# Altium footprint library Footprints.PcbLib: 118 footprints (part 8 of 8)
Each footprint in its own frame and in the unit in brackets; x right, y up, seen from the top. Pads: shape width x height; smd on the part's side, far side on the other; paste and mask are expansions set on the pad; w line width, h text height; cw(c..) or ccw(c..) is an arc to the next point about the centre after c.
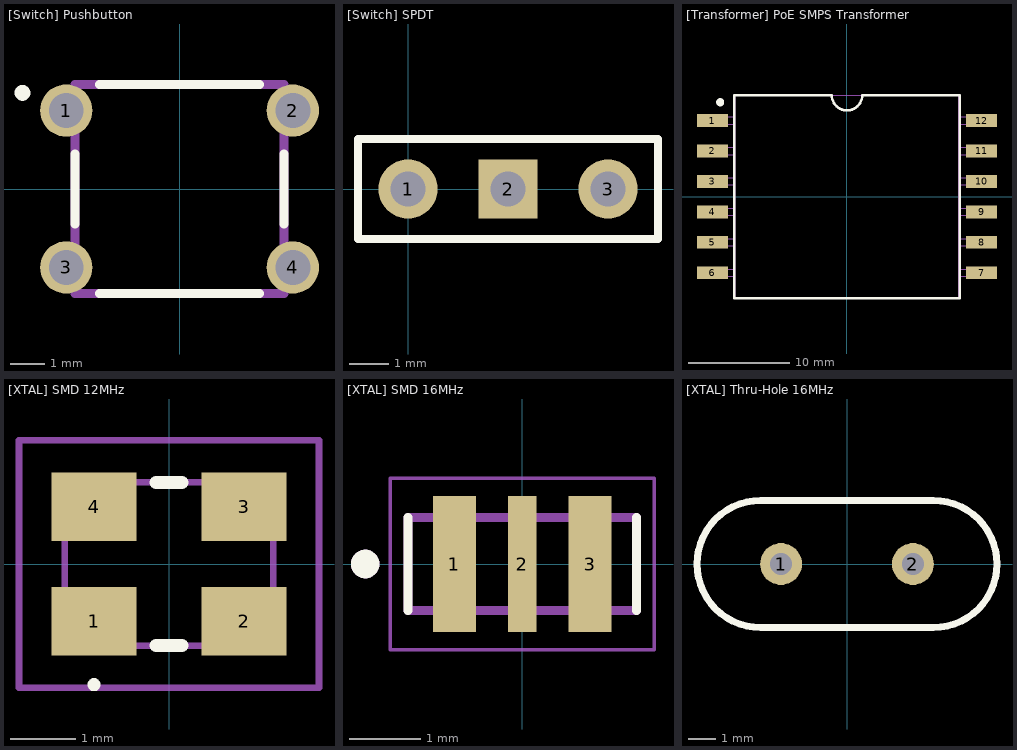
[diagram p7: the footprints below, top view; thin cyan lines are the x and y axes]

## [Switch] Pushbutton [mm] "(Regular pushbutton)"
pads (4):
  round 1.5 hole 1: 1(-3.25,2.25) 2(3.25,2.25) 3(-3.25,-2.25) 4(3.25,-2.25)
Top Overlay:
  circle w0.254: c-4.504,2.757 r0.099
  lines w0.254: -2.995,-1 -2.995,1 ; -2.3,-2.995 2.3,-2.995 ; -2.3,2.995 2.3,2.995 ; 2.995,-1 2.995,1
Physical Outline:
  lines w0.254: -2.995,-2.995 -2.995,2.995 2.995,2.995 2.995,-2.995 -2.995,-2.995
3D body "Pushbutton.STEP": height 4.95, standoff -3.38, extent -3.846,-3.004 3.846,3.004

## [Switch] SPDT [mm]
pads (3):
  round 1.5 hole 0.9: 1(0,0) 3(5.08,0)
  rect 1.5x1.5 hole 0.9: 2(2.54,0)
Top Overlay:
  lines w0.2: -1.27,-1.27 6.35,-1.27 6.35,1.27 -1.27,1.27 -1.27,-1.27
3D body "SPDT Switch.STEP": height 7.15, standoff -3.45, extent -1.71,-1.85 6.79,1.85

## [Transformer] PoE SMPS Transformer [mm] "750313355"
pads (12):
  rect 3.05x1.27 smd: 1(-13.26,7.5) 2(-13.26,4.5) 3(-13.26,1.5) 4(-13.26,-1.5) 5(-13.26,-4.5) 6(-13.26,-7.5) 7(13.26,-7.5) 8(13.26,-4.5) 9(13.26,-1.5) 10(13.26,1.5) 11(13.26,4.5) 12(13.26,7.5)
Top Overlay:
  circle w0.4: c-12.5,9.3 r0.2
  lines w0.254: -11.1,-10 11.1,-10 11.1,10 1.5,10 cw(c0,10) -1.5,10 -11.1,10 -11.1,-10
Physical Outline:
  lines w0.1: -11,-7.85 -14.54,-7.85 -14.54,-7.15 -11,-7.15 ; -11,-4.85 -14.54,-4.85 -14.54,-4.15 -11,-4.15 ; -11,-1.85 -14.54,-1.85 -14.54,-1.15 -11,-1.15 ; -11,1.15 -14.54,1.15 -14.54,1.85 -11,1.85 ; -11,4.15 -14.54,4.15 -14.54,4.85 -11,4.85 ; 11,-7.85 14.54,-7.85 14.54,-7.15 11,-7.15 ; 11,-4.85 14.54,-4.85 14.54,-4.15 11,-4.15 ; 11,-1.85 14.54,-1.85 14.54,-1.15 11,-1.15 ; 11,1.15 14.54,1.15 14.54,1.85 11,1.85 ; 11,4.15 14.54,4.15 14.54,4.85 11,4.85 ; 11,7.15 14.54,7.15 14.54,7.85 11,7.85 ; -11,7.15 -11,7.85 ; -11,7.15 -11,-10 11,-10 11,10 -11,10 -11,7.85 ; -11,7.15 -14.54,7.15 -14.54,7.85 -11,7.85
3D body "PoE Transformer 750313355.STEP": height 10.67, standoff 0, extent -14.325,-10 14.325,10

## [XTAL] SMD 12MHz [mm]
pads (4):
  rect 1.3x1.05 smd: 1(-1.15,-0.875) 2(1.15,-0.875) 3(1.15,0.875) 4(-1.15,0.875)
Top Overlay:
  lines w0.1: -1.15,-1.9 ccw(c-1.15,-1.85) -1.15,-1.8 ccw(c-1.15,-1.85) -1.15,-1.9
  lines w0.2: -0.2,-1.25 0.2,-1.25 ; -0.2,1.25 0.2,1.25
Physical Outline:
  lines w0.1: -1.6,-1.25 1.6,-1.25 1.6,1.25 -1.6,1.25 -1.6,-1.25
Part Border:
  lines w0.1: -2.3,-1.9 2.3,-1.9 2.3,1.9 -2.3,1.9 -2.3,-1.9
3D body "ABM8-272-T3.stp": height 0.75, standoff 0, extent -1.6,-1.25 1.6,1.25

## [XTAL] SMD 16MHz [mm] "CSTCE16M0V53-R0"
pads (3):
  rect 0.6x1.9 smd: 1(-0.95,0) 3(0.95,0)
  rect 0.4x1.9 smd: 2(0,0)
Top Overlay:
  circle w0.2: c-2.2,0 r0.1
  lines w0.127: -1.6,-0.65 -1.6,0.65 ; 1.6,-0.65 1.6,0.65
Physical Outline:
  circle w0.2: c-2.2,0 r0.1
  lines w0.127: -1.6,-0.65 1.6,-0.65 1.6,0.65 -1.6,0.65 -1.6,-0.65
Part Border:
  lines w0.05: -1.85,-1.2 1.85,-1.2 1.85,1.2 -1.85,1.2 -1.85,-1.2
3D body "SMD 16MHz Oscillator (CSTCE16M0V53-R0).STEP": height 1, standoff 0, extent -1.6,-0.65 1.6,0.65

## [XTAL] Thru-Hole 16MHz [mm] "Part #: 2780-HC49US-FF3F18-16.000MHZ-ND"
pads (2):
  round 1.55 hole 0.8: 1(-2.44,0) 2(2.44,0)
Top Overlay:
  lines w0.254: -3.2,-2.35 cw(c-3.2,0) -3.2,2.35 3.2,2.35 cw(c3.2,0) 3.2,-2.35 -3.2,-2.35
3D body "Crystal Oscillator.STEP": height 3.8, standoff -13.03, extent -5.75,-2.5 5.75,2.5